# Altium schematic symbol library Diodes - TVS.SchLib: 5379 symbols (part 11 of 35) (continued)
## RCLAMP1521P.TCT (continued)
TVS DIODE 15V 30V SLP1006P2; Manufacturer: Semtech Corporation; Bidirectional Channels: 1; Capacitance @ Frequency: 0.3pF @ 1MHz; Current - Peak Pulse (10/1000µs): 4A (8/20µs); Power Line Protection: No; Power - Peak Pulse: 120W; Type: Zener; Voltage - Breakdown (Min): 16.7V; Voltage - Reverse Standoff (Typ): 15V (Max); Part Number: RCLAMP1521P.TCT; Applications: General Purpose; ComponentLink1Description: Datasheet; ComponentLink1URL: https://semtech.my.salesforce.com/sfc/p/#E0000000JelG/a/44000000MCUn/HAw56IA3vm9.Fq.kV0q5lKQUjITj9qsZJYMhG0ExhTo; ComponentLink2Description: DigiKey Link; ComponentLink2URL: http://digikey.com/product-detail/en/semtech-corporation/RCLAMP1521P.TCT/RCLAMP1521P.TCTCT-ND/5113723; Device Package: 0402 (1006 Metric); LastUpdated: 9/2/2020 1:28:48 AM; Lifecycle Status: Active; Minimum Order: 1; Mounting Type: Surface Mount; Operating Temperature: -55°C ~ 125°C (TJ); Package / Case: 0402 (1006 Metric); Packaging: TapeAndReel; PartId: 10409; Part Status: Active; Price: 0.33; Series: RailClamp®; Supplier 1: DigiKey; Supplier Part Number 1: RCLAMP1521P.TCTCT-ND; Supplier Device Package: SLP1006P2; Voltage - Clamping (Max) @ Ipp: 30V
footprint 0402
pins: 1, 2

## RCLAMP1521PQTCT
designator D?
TVS DIODE 15V 35V SLP1006P2; Manufacturer: Semtech Corporation; Bidirectional Channels: 1; Capacitance @ Frequency: 0.3pF @ 1MHz; Current - Peak Pulse (10/1000µs): 4A (8/20µs); Power Line Protection: No; Power - Peak Pulse: 120W; Type: Zener; Voltage - Breakdown (Min): 16.7V; Voltage - Reverse Standoff (Typ): 15V (Max); Part Number: RCLAMP1521PQTCT; Applications: Automotive; ComponentLink1Description: Datasheet; ComponentLink1URL: https://www.semtech.com/uploads/documents/rclamp1521pq.pdf; ComponentLink2Description: DigiKey Link; ComponentLink2URL: http://digikey.com/product-detail/en/semtech-corporation/RCLAMP1521PQTCT/RCLAMP1521PQTCTCT-ND/4626687; Device Package: 0402 (1006 Metric); LastUpdated: 9/2/2020 1:28:49 AM; Lifecycle Status: Active; Minimum Order: 1; Mounting Type: Surface Mount; Operating Temperature: -40°C ~ 125°C (TJ); Package / Case: 0402 (1006 Metric); Packaging: TapeAndReel; PartId: 10488; Part Status: Active; Price: 0.40; Series: Automotive, AEC-Q100, RailClamp®; Supplier 1: DigiKey; Supplier Part Number 1: RCLAMP1521PQTCTCT-ND; Supplier Device Package: SLP1006P2; Voltage - Clamping (Max) @ Ipp: 35V
footprint 0402
pins: 1, 2

## RCLAMP2431T.TCT
designator D?
TVS DIODE 24V 50V SLP1006P2T; Manufacturer: Semtech Corporation; Bidirectional Channels: 1; Capacitance @ Frequency: 0.35pF @ 1MHz; Current - Peak Pulse (10/1000µs): 2A (8/20µs); Power Line Protection: No; Power - Peak Pulse: 100W; Type: Zener; Voltage - Breakdown (Min): 26.7V; Voltage - Reverse Standoff (Typ): 24V (Max); Part Number: RCLAMP2431T.TCT; Applications: General Purpose; ComponentLink1Description: Datasheet; ComponentLink1URL: https://www.semtech.com/uploads/documents/rclamp2431t.pdf; ComponentLink2Description: DigiKey Link; ComponentLink2URL: http://digikey.com/product-detail/en/semtech-corporation/RCLAMP2431T.TCT/RCLAMP2431TTCTCT-ND/4626689; Device Package: 0402 (1006 Metric); LastUpdated: 9/2/2020 1:28:48 AM; Lifecycle Status: Active; Minimum Order: 1; Mounting Type: Surface Mount; Operating Temperature: -40°C ~ 85°C (TJ); Package / Case: 0402 (1006 Metric); Packaging: TapeAndReel; PartId: 10436; Part Status: Active; Price: 0.35; Series: RailClamp®; Supplier 1: DigiKey; Supplier Part Number 1: RCLAMP2431TTCTCT-ND; Supplier Device Package: SLP1006P2T; Voltage - Clamping (Max) @ Ipp: 50V
footprint 0402
pins: 1, 2

## RCLAMP2431TQTCT
designator D?
TVS DIODE 24V 50V SLP1006P2T; Manufacturer: Semtech Corporation; Bidirectional Channels: 1; Capacitance @ Frequency: 0.35pF @ 1MHz; Current - Peak Pulse (10/1000µs): 2A (8/20µs); Power Line Protection: No; Power - Peak Pulse: 100W; Type: Zener; Voltage - Breakdown (Min): 26.7V; Voltage - Reverse Standoff (Typ): 24V (Max); Part Number: RCLAMP2431TQTCT; Applications: Automotive; ComponentLink1Description: Datasheet; ComponentLink1URL: https://www.semtech.com/uploads/documents/rclamp2431tq.pdf; ComponentLink2Description: DigiKey Link; ComponentLink2URL: http://digikey.com/product-detail/en/semtech-corporation/RCLAMP2431TQTCT/RCLAMP2431TQTCTCT-ND/4626690; Device Package: 0402 (1006 Metric); LastUpdated: 9/2/2020 1:28:48 AM; Lifecycle Status: Active; Minimum Order: 1; Mounting Type: Surface Mount; Operating Temperature: -40°C ~ 125°C (TJ); Package / Case: 0402 (1006 Metric); Packaging: TapeAndReel; PartId: 10407; Part Status: Active; Price: 0.47; Series: Automotive, AEC-Q100, RailClamp®; Supplier 1: DigiKey; Supplier Part Number 1: RCLAMP2431TQTCTCT-ND; Supplier Device Package: SLP1006P2T; Voltage - Clamping (Max) @ Ipp: 50V
footprint 0402
pins: 1, 2

## RCLAMP3321P.TNT
designator D?
TVS DIODE 3.3V 13V SLP1006P2; Manufacturer: Semtech Corporation; Bidirectional Channels: 1; Capacitance @ Frequency: 0.22pF @ 1MHz; Current - Peak Pulse (10/1000µs): 4A (8/20µs); Power Line Protection: No; Power - Peak Pulse: 25W; Type: Zener; Voltage - Breakdown (Min): 5.5V; Voltage - Reverse Standoff (Typ): 3.3V (Max); Part Number: RCLAMP3321P.TNT; Applications: HDMI; ComponentLink1Description: Datasheet; ComponentLink1URL: https://www.semtech.com/uploads/documents/rclamp3321p.pdf; ComponentLink2Description: DigiKey Link; ComponentLink2URL: http://digikey.com/product-detail/en/semtech-corporation/RCLAMP3321P.TNT/RCLAMP3321P.TNTCT-ND/5067283; Device Package: 0402 (1006 Metric); LastUpdated: 9/2/2020 1:28:48 AM; Lifecycle Status: Active; Minimum Order: 1; Mounting Type: Surface Mount; Operating Temperature: -55°C ~ 125°C (TJ); Package / Case: 0402 (1006 Metric); Packaging: TapeAndReel; PartId: 10417; Part Status: Active; Price: 0.25; Series: RailClamp®; Supplier 1: DigiKey; Supplier Part Number 1: RCLAMP3321P.TNTCT-ND; Supplier Device Package: SLP1006P2; Voltage - Clamping (Max) @ Ipp: 13V
footprint 0402
pins: 1, 2

## RCLAMP3521P.TNT
designator D?
TVS DIODE 3.5V 13V SLP1006P2; Manufacturer: Semtech Corporation; Bidirectional Channels: 1; Capacitance @ Frequency: 0.33pF @ 1MHz; Current - Peak Pulse (10/1000µs): 4A (8/20µs); Power Line Protection: No; Power - Peak Pulse: 50W; Type: Zener; Voltage - Breakdown (Min): 4.5V; Voltage - Reverse Standoff (Typ): 3.5V (Max); Part Number: RCLAMP3521P.TNT; Applications: General Purpose; ComponentLink1Description: Datasheet; ComponentLink1URL: https://www.semtech.com/uploads/documents/RClamp3521P.pdf; ComponentLink2Description: DigiKey Link; ComponentLink2URL: http://digikey.com/product-detail/en/semtech-corporation/RCLAMP3521P.TNT/RCLAMP3521P.TNTCT-ND/5226788; Device Package: 0402 (1006 Metric); LastUpdated: 9/2/2020 1:28:48 AM; Lifecycle Status: Active; Minimum Order: 1; Mounting Type: Surface Mount; Operating Temperature: -40°C ~ 125°C (TJ); Package / Case: 0402 (1006 Metric); Packaging: TapeAndReel; PartId: 10419; Part Status: Active; Price: 0.25; Series: RailClamp®; Supplier 1: DigiKey; Supplier Part Number 1: RCLAMP3521P.TNTCT-ND; Supplier Device Package: SLP1006P2; Voltage - Clamping (Max) @ Ipp: 13V
footprint 0402
pins: 1, 2

## RSB5.6SMFHT2N
designator D?
BI-DIRECTIONAL ZENER DIODES (COR; Manufacturer: Rohm Semiconductor; Bidirectional Channels: 1; Capacitance @ Frequency: 50pF @ 1MHz; Power Line Protection: No; Power - Peak Pulse: 10W; Part Number: RSB5.6SMFHT2N; Applications: Automotive; ComponentLink1Description: Datasheet; ComponentLink1URL: https://www.rohm.com/datasheet/RSB5.6SMFH/rsb5.6smfh; ComponentLink2Description: DigiKey Link; ComponentLink2URL: http://digikey.com/product-detail/en/rohm-semiconductor/RSB5.6SMFHT2N/RSB5.6SMFHT2NTR-ND/9697321; LastUpdated: 9/2/2020 1:28:25 AM; Lifecycle Status: Active; Minimum Order: 0; Mounting Type: Surface Mount; Operating Temperature: 150°C (TJ); Package / Case: SC-79, SOD-523; Packaging: TapeAndReel; PartId: 9825; Part Status: Active; Price: 0.08; Series: Automotive, AEC-Q101; Supplier 1: DigiKey; Supplier Part Number 1: RSB5.6SMFHT2NTR-ND; Supplier Device Package: EMD2; Type: Zener
footprint SOD523F
pins: 1, 2

## RSB5.6SMT2N
designator D?
TVS DIODE 2.5V EMD2; Manufacturer: Rohm Semiconductor; Bidirectional Channels: 1; Power Line Protection: No; Power - Peak Pulse: 10W; Type: Zener; Voltage - Breakdown (Min): 4.76V; Part Number: RSB5.6SMT2N; Applications: General Purpose; ComponentLink1Description: Datasheet; ComponentLink1URL: http://rohmfs.rohm.com/en/products/databook/datasheet/discrete/diode/zener/rsb5.6sm.pdf; ComponentLink2Description: DigiKey Link; ComponentLink2URL: http://digikey.com/product-detail/en/rohm-semiconductor/RSB5.6SMT2N/RSB5.6SMT2NTR-ND/3443621; LastUpdated: 9/2/2020 1:28:25 AM; Lifecycle Status: Active; Minimum Order: 0; Mounting Type: Surface Mount; Operating Temperature: -55°C ~ 150°C (TJ); Package / Case: SC-79, SOD-523; Packaging: TapeAndReel; PartId: 9813; Part Status: Active; Price: 0.05; Series: -; Supplier 1: DigiKey; Supplier Part Number 1: RSB5.6SMT2NTR-ND; Supplier Device Package: EMD2; Voltage - Reverse Standoff (Typ): 2.5V
footprint SOD523F
pins: 1, 2

## RSB6.8SMFHT2N
designator D?
BI-DIRECTIONAL ZENER DIODES (COR; Manufacturer: Rohm Semiconductor; Bidirectional Channels: 1; Capacitance @ Frequency: 30pF @ 1MHz; Power Line Protection: No; Power - Peak Pulse: 10W; Part Number: RSB6.8SMFHT2N; Applications: Automotive; ComponentLink1Description: Datasheet; ComponentLink1URL: https://www.rohm.com/datasheet/RSB6.8SMFH/rsb6.8smfh; ComponentLink2Description: DigiKey Link; ComponentLink2URL: http://digikey.com/product-detail/en/rohm-semiconductor/RSB6.8SMFHT2N/RSB6.8SMFHT2NTR-ND/9697322; LastUpdated: 9/2/2020 1:28:25 AM; Lifecycle Status: Active; Minimum Order: 0; Mounting Type: Surface Mount; Operating Temperature: 150°C (TJ); Package / Case: SC-79, SOD-523; Packaging: TapeAndReel; PartId: 9826; Part Status: Active; Price: 0.08; Series: Automotive, AEC-Q101; Supplier 1: DigiKey; Supplier Part Number 1: RSB6.8SMFHT2NTR-ND; Supplier Device Package: EMD2; Type: Zener
footprint SOD523F
pins: 1, 2

## RSB6.8SMT2N
designator D?
TVS DIODE 3.5V EMD2; Manufacturer: Rohm Semiconductor; Bidirectional Channels: 1; Capacitance @ Frequency: 30pF @ 1MHz; Power Line Protection: No; Power - Peak Pulse: 10W; Type: Zener; Voltage - Breakdown (Min): 5.78V; Part Number: RSB6.8SMT2N; Applications: General Purpose; ComponentLink1Description: Datasheet; ComponentLink1URL: http://rohmfs.rohm.com/en/products/databook/datasheet/discrete/diode/zener/rsb6.8sm.pdf; ComponentLink2Description: DigiKey Link; ComponentLink2URL: http://digikey.com/product-detail/en/rohm-semiconductor/RSB6.8SMT2N/RSB6.8SMT2NTR-ND/5721280; LastUpdated: 9/2/2020 1:28:25 AM; Lifecycle Status: Active; Minimum Order: 0; Mounting Type: Surface Mount; Operating Temperature: -55°C ~ 150°C (TJ); Package / Case: SC-79, SOD-523; Packaging: TapeAndReel; PartId: 9814; Part Status: Active; Price: 0.05; Series: -; Supplier 1: DigiKey; Supplier Part Number 1: RSB6.8SMT2NTR-ND; Supplier Device Package: EMD2; Voltage - Reverse Standoff (Typ): 3.5V
footprint SOD523F
pins: 1, 2

## RSB16VTE-17
designator D?
TVS DIODE 12V UMD2; Manufacturer: Rohm Semiconductor; Bidirectional Channels: 1; Power Line Protection: No; Type: Zener; Voltage - Breakdown (Min): 14.4V; Part Number: RSB16VTE-17; Applications: General Purpose; ComponentLink1Description: Datasheet; ComponentLink1URL: http://rohmfs.rohm.com/en/products/databook/datasheet/discrete/diode/zener/rsb16v.pdf; ComponentLink2Description: DigiKey Link; ComponentLink2URL: http://digikey.com/product-detail/en/rohm-semiconductor/RSB16VTE-17/RSB16VTE-17TR-ND/2095518; LastUpdated: 9/2/2020 1:28:42 AM; Lifecycle Status: Active; Minimum Order: 0; Mounting Type: Surface Mount; Package / Case: SC-90, SOD-323F; Packaging: TapeAndReel; PartId: 10362; Part Status: Active; Price: 0.11; Series: -; Supplier 1: DigiKey; Supplier Part Number 1: RSB16VTE-17TR-ND; Supplier Device Package: UMD2; Voltage - Reverse Standoff (Typ): 12V
footprint SOD323F
pins: 1, 2

## RSB18VTE-17
designator D?
TVS DIODE 13V UMD2; Manufacturer: Rohm Semiconductor; Bidirectional Channels: 1; Power Line Protection: No; Type: Zener; Voltage - Breakdown (Min): 16.2V; Part Number: RSB18VTE-17; Applications: General Purpose; ComponentLink1Description: Datasheet; ComponentLink1URL: http://rohmfs.rohm.com/en/products/databook/datasheet/discrete/diode/zener/rsb18v.pdf; ComponentLink2Description: DigiKey Link; ComponentLink2URL: http://digikey.com/product-detail/en/rohm-semiconductor/RSB18VTE-17/RSB18VTE-17TR-ND/2095520; LastUpdated: 9/2/2020 1:28:42 AM; Lifecycle Status: Active; Minimum Order: 0; Mounting Type: Surface Mount; Package / Case: SC-90, SOD-323F; Packaging: TapeAndReel; PartId: 10361; Part Status: Active; Price: 0.11; Series: -; Supplier 1: DigiKey; Supplier Part Number 1: RSB18VTE-17TR-ND; Supplier Device Package: UMD2; Voltage - Reverse Standoff (Typ): 13V
footprint SOD323F
pins: 1, 2

## RSB27VTE-17
designator D?
TVS DIODE 24V UMD2; Manufacturer: Rohm Semiconductor; Bidirectional Channels: 1; Power Line Protection: No; Type: Zener; Voltage - Breakdown (Min): 26.2V; Part Number: RSB27VTE-17; Applications: General Purpose; ComponentLink1Description: Datasheet; ComponentLink1URL: http://rohmfs.rohm.com/en/products/databook/datasheet/discrete/diode/zener/rsb27v.pdf; ComponentLink2Description: DigiKey Link; ComponentLink2URL: http://digikey.com/product-detail/en/rohm-semiconductor/RSB27VTE-17/RSB27VTE-17TR-ND/2095522; LastUpdated: 9/2/2020 1:28:42 AM; Lifecycle Status: Active; Minimum Order: 0; Mounting Type: Surface Mount; Package / Case: SC-90, SOD-323F; Packaging: TapeAndReel; PartId: 10358; Part Status: Active; Price: 0.11; Series: -; Supplier 1: DigiKey; Supplier Part Number 1: RSB27VTE-17TR-ND; Supplier Device Package: UMD2; Voltage - Reverse Standoff (Typ): 24V
footprint SOD323F
pins: 1, 2

## RSB33VTE-17
designator D?
TVS DIODE 25V UMD2; Manufacturer: Rohm Semiconductor; Bidirectional Channels: 1; Capacitance @ Frequency: 30pF @ 1MHz; Power Line Protection: No; Type: Zener; Voltage - Breakdown (Min): 29.7V; Part Number: RSB33VTE-17; Applications: General Purpose; ComponentLink1Description: Datasheet; ComponentLink1URL: http://rohmfs.rohm.com/en/products/databook/datasheet/discrete/diode/zener/rsb33v.pdf; ComponentLink2Description: DigiKey Link; ComponentLink2URL: http://digikey.com/product-detail/en/rohm-semiconductor/RSB33VTE-17/RSB33VTE-17TR-ND/3443618; LastUpdated: 9/2/2020 1:28:42 AM; Lifecycle Status: Active; Minimum Order: 0; Mounting Type: Surface Mount; Package / Case: SC-90, SOD-323F; Packaging: TapeAndReel; PartId: 10360; Part Status: Active; Price: 0.10; Series: -; Supplier 1: DigiKey; Supplier Part Number 1: RSB33VTE-17TR-ND; Supplier Device Package: UMD2; Voltage - Reverse Standoff (Typ): 25V
footprint SOD323F
pins: 1, 2

## RSB36VTE-17
designator D?
TVS DIODE 27V UMD2; Manufacturer: Rohm Semiconductor; Bidirectional Channels: 1; Capacitance @ Frequency: 30pF @ 1MHz; Power Line Protection: No; Type: Zener; Voltage - Breakdown (Min): 32.4V; Part Number: RSB36VTE-17; Applications: General Purpose; ComponentLink1Description: Datasheet; ComponentLink1URL: http://rohmfs.rohm.com/en/products/databook/datasheet/discrete/diode/zener/rsb36v.pdf; ComponentLink2Description: DigiKey Link; ComponentLink2URL: http://digikey.com/product-detail/en/rohm-semiconductor/RSB36VTE-17/RSB36VTE-17TR-ND/3443619; LastUpdated: 9/2/2020 1:28:42 AM; Lifecycle Status: Active; Minimum Order: 0; Mounting Type: Surface Mount; Package / Case: SC-90, SOD-323F; Packaging: TapeAndReel; PartId: 10363; Part Status: Active; Price: 0.10; Series: -; Supplier 1: DigiKey; Supplier Part Number 1: RSB36VTE-17TR-ND; Supplier Device Package: UMD2; Voltage - Reverse Standoff (Typ): 27V
footprint SOD323F
pins: 1, 2

## RSB39VTE-17
designator D?
TVS DIODE 30V UMD2; Manufacturer: Rohm Semiconductor; Bidirectional Channels: 1; Capacitance @ Frequency: 30pF @ 1MHz; Power Line Protection: No; Type: Zener; Voltage - Breakdown (Min): 35.1V; Part Number: RSB39VTE-17; Applications: General Purpose; ComponentLink1Description: Datasheet; ComponentLink1URL: http://rohmfs.rohm.com/en/products/databook/datasheet/discrete/diode/zener/rsb39v.pdf; ComponentLink2Description: DigiKey Link; ComponentLink2URL: http://digikey.com/product-detail/en/rohm-semiconductor/RSB39VTE-17/RSB39VTE-17TR-ND/3443620; LastUpdated: 9/2/2020 1:28:42 AM; Lifecycle Status: Active; Minimum Order: 0; Mounting Type: Surface Mount; Package / Case: SC-90, SOD-323F; Packaging: TapeAndReel; PartId: 10359; Part Status: Active; Price: 0.08; Series: -; Supplier 1: DigiKey; Supplier Part Number 1: RSB39VTE-17TR-ND; Supplier Device Package: UMD2; Voltage - Reverse Standoff (Typ): 30V
footprint SOD323F
pins: 1, 2

## SACB5.0
designator D?
TVS DIODE 5V 10V SMB; Manufacturer: Littelfuse Inc.; Current - Peak Pulse (10/1000µs): 44A; Power Line Protection: No; Power - Peak Pulse: 500W; Type: Zener; Unidirectional Channels: 1; Voltage - Breakdown (Min): 7.6V; Part Number: SACB5.0; Applications: General Purpose; ComponentLink1Description: Datasheet; ComponentLink1URL: https://www.littelfuse.com/~/media/electronics/datasheets/tvs_diodes/littelfuse_tvs_diode_sacb_datasheet.pdf.pdf; ComponentLink2Description: DigiKey Link; ComponentLink2URL: http://digikey.com/product-detail/en/littelfuse-inc/SACB5.0/SACB5.0CT-ND/1835351; LastUpdated: 9/2/2020 1:19:43 AM; Lifecycle Status: Active; Minimum Order: 1; Mounting Type: Surface Mount; Operating Temperature: -55°C ~ 150°C (TJ); Package / Case: DO-214AA, SMB; Packaging: TapeAndReel; PartId: 10519; Part Status: Active; Price: 0.24; Series: SACB; Supplier 1: DigiKey; Supplier Part Number 1: SACB5.0CT-ND; Supplier Device Package: SMB; Voltage - Clamping (Max) @ Ipp: 10V; Voltage - Reverse Standoff (Typ): 5V
footprint DO214AA SMB
pins: 1, 2

## SACB6.0
designator D?
TVS DIODE 6V 11.2V SMB; Manufacturer: Littelfuse Inc.; Current - Peak Pulse (10/1000µs): 41A; Power Line Protection: No; Power - Peak Pulse: 500W; Type: Zener; Unidirectional Channels: 1; Voltage - Breakdown (Min): 7.9V; Part Number: SACB6.0; Applications: General Purpose; ComponentLink1Description: Datasheet; ComponentLink1URL: https://www.littelfuse.com/~/media/electronics/datasheets/tvs_diodes/littelfuse_tvs_diode_sacb_datasheet.pdf.pdf; ComponentLink2Description: DigiKey Link; ComponentLink2URL: http://digikey.com/product-detail/en/littelfuse-inc/SACB6.0/SACB6.0CT-ND/2699865; LastUpdated: 9/2/2020 1:19:43 AM; Lifecycle Status: Active; Minimum Order: 1; Mounting Type: Surface Mount; Operating Temperature: -55°C ~ 150°C (TJ); Package / Case: DO-214AA, SMB; Packaging: TapeAndReel; PartId: 10521; Part Status: Active; Price: 0.24; Series: SACB; Supplier 1: DigiKey; Supplier Part Number 1: SACB6.0CT-ND; Supplier Device Package: SMB; Voltage - Clamping (Max) @ Ipp: 11.2V; Voltage - Reverse Standoff (Typ): 6V
footprint DO214AA SMB
pins: 1, 2

## SACB7.0
designator D?
TVS DIODE 7V 12.6V SMB; Manufacturer: Littelfuse Inc.; Current - Peak Pulse (10/1000µs): 38A; Power Line Protection: No; Power - Peak Pulse: 500W; Type: Zener; Unidirectional Channels: 1; Voltage - Breakdown (Min): 8.33V; Part Number: SACB7.0; Applications: General Purpose; ComponentLink1Description: Datasheet; ComponentLink1URL: https://www.littelfuse.com/~/media/electronics/datasheets/tvs_diodes/littelfuse_tvs_diode_sacb_datasheet.pdf.pdf; ComponentLink2Description: DigiKey Link; ComponentLink2URL: http://digikey.com/product-detail/en/littelfuse-inc/SACB7.0/SACB7.0CT-ND/2699866; LastUpdated: 9/2/2020 1:19:46 AM; Lifecycle Status: Active; Minimum Order: 1; Mounting Type: Surface Mount; Operating Temperature: -55°C ~ 150°C (TJ); Package / Case: DO-214AA, SMB; Packaging: TapeAndReel; PartId: 10823; Part Status: Active; Price: 0.24; Series: SACB; Supplier 1: DigiKey; Supplier Part Number 1: SACB7.0CT-ND; Supplier Device Package: SMB; Voltage - Clamping (Max) @ Ipp: 12.6V; Voltage - Reverse Standoff (Typ): 7V
footprint DO214AA SMB
pins: 1, 2

## SACB8.0
designator D?
TVS DIODE 8V 13.4V DO214AA; Manufacturer: Littelfuse Inc.; Current - Peak Pulse (10/1000µs): 36A; Power Line Protection: No; Power - Peak Pulse: 500W; Type: Zener; Unidirectional Channels: 1; Voltage - Breakdown (Min): 8.89V; Part Number: SACB8.0; Applications: General Purpose; ComponentLink1Description: Datasheet; ComponentLink1URL: https://www.littelfuse.com/~/media/electronics/datasheets/tvs_diodes/littelfuse_tvs_diode_sacb_datasheet.pdf.pdf; ComponentLink2Description: DigiKey Link; ComponentLink2URL: http://digikey.com/product-detail/en/littelfuse-inc/SACB8.0/1294-SACB8.0-CHP/5731810; LastUpdated: 9/2/2020 1:19:49 AM; Lifecycle Status: Active; Minimum Order: 3000; Mounting Type: Surface Mount; Operating Temperature: -55°C ~ 150°C (TJ); Package / Case: DO-214AA, SMB; Packaging: TapeAndReel; PartId: 11154; Part Status: Active; Price: 0.18; Series: SACB; Supplier 1: DigiKey; Supplier Part Number 1: 1294-SACB8.0-CHP; Supplier Device Package: DO-214AA (SMBJ); Voltage - Clamping (Max) @ Ipp: 13.4V; Voltage - Reverse Standoff (Typ): 8V
footprint DO214AA SMB
pins: 1, 2

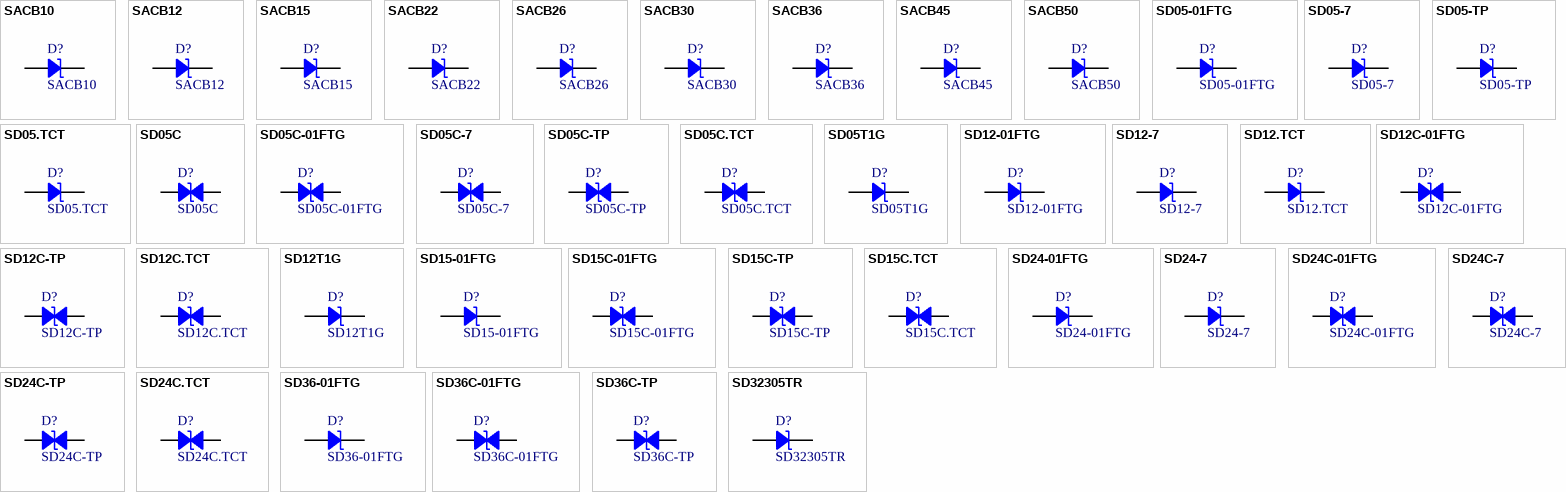
[diagram p39: symbols SACB10 to SD32305TR]

## SACB10
designator D?
TVS DIODE 10V 16.3V SMB; Manufacturer: Littelfuse Inc.; Current - Peak Pulse (10/1000µs): 29A; Power Line Protection: No; Power - Peak Pulse: 500W; Type: Zener; Unidirectional Channels: 1; Voltage - Breakdown (Min): 11.1V; Part Number: SACB10; Applications: General Purpose; ComponentLink1Description: Datasheet; ComponentLink1URL: https://www.littelfuse.com/~/media/electronics/datasheets/tvs_diodes/littelfuse_tvs_diode_sacb_datasheet.pdf.pdf; ComponentLink2Description: DigiKey Link; ComponentLink2URL: http://digikey.com/product-detail/en/littelfuse-inc/SACB10/SACB10CT-ND/2699857; LastUpdated: 9/2/2020 1:19:45 AM; Lifecycle Status: Active; Minimum Order: 1; Mounting Type: Surface Mount; Operating Temperature: -55°C ~ 150°C (TJ); Package / Case: DO-214AA, SMB; Packaging: TapeAndReel; PartId: 10730; Part Status: Active; Price: 0.18; Series: SACB; Supplier 1: DigiKey; Supplier Part Number 1: SACB10CT-ND; Supplier Device Package: SMB; Voltage - Clamping (Max) @ Ipp: 16.3V; Voltage - Reverse Standoff (Typ): 10V
footprint DO214AA SMB
pins: 1, 2

## SACB12
designator D?
TVS DIODE 12V 19V SMB; Manufacturer: Littelfuse Inc.; Current - Peak Pulse (10/1000µs): 25A; Power Line Protection: No; Power - Peak Pulse: 500W; Type: Zener; Unidirectional Channels: 1; Voltage - Breakdown (Min): 13.3V; Part Number: SACB12; Applications: General Purpose; ComponentLink1Description: Datasheet; ComponentLink1URL: https://www.littelfuse.com/~/media/electronics/datasheets/tvs_diodes/littelfuse_tvs_diode_sacb_datasheet.pdf.pdf; ComponentLink2Description: DigiKey Link; ComponentLink2URL: http://digikey.com/product-detail/en/littelfuse-inc/SACB12/SACB12CT-ND/1835352; LastUpdated: 9/2/2020 1:19:47 AM; Lifecycle Status: Active; Minimum Order: 1; Mounting Type: Surface Mount; Operating Temperature: -55°C ~ 150°C (TJ); Package / Case: DO-214AA, SMB; Packaging: TapeAndReel; PartId: 10900; Part Status: Active; Price: 0.24; Series: SACB; Supplier 1: DigiKey; Supplier Part Number 1: SACB12CT-ND; Supplier Device Package: SMB; Voltage - Clamping (Max) @ Ipp: 19V; Voltage - Reverse Standoff (Typ): 12V
footprint DO214AA SMB
pins: 1, 2

## SACB15
designator D?
TVS DIODE 15V 23.6V SMB; Manufacturer: Littelfuse Inc.; Current - Peak Pulse (10/1000µs): 20A; Power Line Protection: No; Power - Peak Pulse: 500W; Type: Zener; Unidirectional Channels: 1; Voltage - Breakdown (Min): 16.7V; Part Number: SACB15; Applications: General Purpose; ComponentLink1Description: Datasheet; ComponentLink1URL: https://www.littelfuse.com/~/media/electronics/datasheets/tvs_diodes/littelfuse_tvs_diode_sacb_datasheet.pdf.pdf; ComponentLink2Description: DigiKey Link; ComponentLink2URL: http://digikey.com/product-detail/en/littelfuse-inc/SACB15/SACB15CT-ND/2699858; LastUpdated: 9/2/2020 1:19:51 AM; Lifecycle Status: Active; Minimum Order: 1; Mounting Type: Surface Mount; Operating Temperature: -55°C ~ 150°C (TJ); Package / Case: DO-214AA, SMB; Packaging: TapeAndReel; PartId: 11310; Part Status: Active; Price: 0.24; Series: SACB; Supplier 1: DigiKey; Supplier Part Number 1: SACB15CT-ND; Supplier Device Package: SMB; Voltage - Clamping (Max) @ Ipp: 23.6V; Voltage - Reverse Standoff (Typ): 15V
footprint DO214AA SMB
pins: 1, 2

## SACB22
designator D?
TVS DIODE 22V 35.4V SMB; Manufacturer: Littelfuse Inc.; Current - Peak Pulse (10/1000µs): 14A; Power Line Protection: No; Power - Peak Pulse: 500W; Type: Zener; Unidirectional Channels: 1; Voltage - Breakdown (Min): 24.4V; Part Number: SACB22; Applications: General Purpose; ComponentLink1Description: Datasheet; ComponentLink1URL: https://www.littelfuse.com/~/media/electronics/datasheets/tvs_diodes/littelfuse_tvs_diode_sacb_datasheet.pdf.pdf; ComponentLink2Description: DigiKey Link; ComponentLink2URL: http://digikey.com/product-detail/en/littelfuse-inc/SACB22/SACB22CT-ND/2699859; LastUpdated: 9/2/2020 1:19:43 AM; Lifecycle Status: Active; Minimum Order: 1; Mounting Type: Surface Mount; Operating Temperature: -55°C ~ 150°C (TJ); Package / Case: DO-214AA, SMB; Packaging: TapeAndReel; PartId: 10518; Part Status: Active; Price: 0.24; Series: SACB; Supplier 1: DigiKey; Supplier Part Number 1: SACB22CT-ND; Supplier Device Package: SMB; Voltage - Clamping (Max) @ Ipp: 35.4V; Voltage - Reverse Standoff (Typ): 22V
footprint DO214AA SMB
pins: 1, 2

## SACB26
designator D?
TVS DIODE 26V 42.3V SMB; Manufacturer: Littelfuse Inc.; Current - Peak Pulse (10/1000µs): 11.1A; Power Line Protection: No; Power - Peak Pulse: 500W; Type: Zener; Unidirectional Channels: 1; Voltage - Breakdown (Min): 28.9V; Part Number: SACB26; Applications: General Purpose; ComponentLink1Description: Datasheet; ComponentLink1URL: https://www.littelfuse.com/~/media/electronics/datasheets/tvs_diodes/littelfuse_tvs_diode_sacb_datasheet.pdf.pdf; ComponentLink2Description: DigiKey Link; ComponentLink2URL: http://digikey.com/product-detail/en/littelfuse-inc/SACB26/SACB26CT-ND/2699860; LastUpdated: 9/2/2020 1:19:45 AM; Lifecycle Status: Active; Minimum Order: 1; Mounting Type: Surface Mount; Operating Temperature: -55°C ~ 150°C (TJ); Package / Case: DO-214AA, SMB; Packaging: TapeAndReel; PartId: 10729; Part Status: Active; Price: 0.24; Series: SACB; Supplier 1: DigiKey; Supplier Part Number 1: SACB26CT-ND; Supplier Device Package: SMB; Voltage - Clamping (Max) @ Ipp: 42.3V; Voltage - Reverse Standoff (Typ): 26V
footprint DO214AA SMB
pins: 1, 2

## SACB30
designator D?
TVS DIODE 30V 48.6V SMB; Manufacturer: Littelfuse Inc.; Current - Peak Pulse (10/1000µs): 10A; Power Line Protection: No; Power - Peak Pulse: 500W; Type: Zener; Unidirectional Channels: 1; Voltage - Breakdown (Min): 33.3V; Part Number: SACB30; Applications: General Purpose; ComponentLink1Description: Datasheet; ComponentLink1URL: https://www.littelfuse.com/~/media/electronics/datasheets/tvs_diodes/littelfuse_tvs_diode_sacb_datasheet.pdf.pdf; ComponentLink2Description: DigiKey Link; ComponentLink2URL: http://digikey.com/product-detail/en/littelfuse-inc/SACB30/SACB30CT-ND/2699861; LastUpdated: 9/2/2020 1:19:45 AM; Lifecycle Status: Active; Minimum Order: 1; Mounting Type: Surface Mount; Operating Temperature: -55°C ~ 150°C (TJ); Package / Case: DO-214AA, SMB; Packaging: TapeAndReel; PartId: 10731; Part Status: Active; Price: 0.24; Series: SACB; Supplier 1: DigiKey; Supplier Part Number 1: SACB30CT-ND; Supplier Device Package: SMB; Voltage - Clamping (Max) @ Ipp: 48.6V; Voltage - Reverse Standoff (Typ): 30V
footprint DO214AA SMB
pins: 1, 2

## SACB36
designator D?
TVS DIODE 36V 60V SMB; Manufacturer: Littelfuse Inc.; Current - Peak Pulse (10/1000µs): 8.6A; Power Line Protection: No; Power - Peak Pulse: 500W; Type: Zener; Unidirectional Channels: 1; Voltage - Breakdown (Min): 40V; Part Number: SACB36; Applications: General Purpose; ComponentLink1Description: Datasheet; ComponentLink1URL: https://www.littelfuse.com/~/media/electronics/datasheets/tvs_diodes/littelfuse_tvs_diode_sacb_datasheet.pdf.pdf; ComponentLink2Description: DigiKey Link; ComponentLink2URL: http://digikey.com/product-detail/en/littelfuse-inc/SACB36/SACB36CT-ND/2699862; LastUpdated: 9/2/2020 1:19:43 AM; Lifecycle Status: Active; Minimum Order: 1; Mounting Type: Surface Mount; Operating Temperature: -55°C ~ 150°C (TJ); Package / Case: DO-214AA, SMB; Packaging: TapeAndReel; PartId: 10522; Part Status: Active; Price: 0.24; Series: SACB; Supplier 1: DigiKey; Supplier Part Number 1: SACB36CT-ND; Supplier Device Package: SMB; Voltage - Clamping (Max) @ Ipp: 60V; Voltage - Reverse Standoff (Typ): 36V
footprint DO214AA SMB
pins: 1, 2

## SACB45
designator D?
TVS DIODE 45V 77V SMB; Manufacturer: Littelfuse Inc.; Current - Peak Pulse (10/1000µs): 6.8A; Power Line Protection: No; Power - Peak Pulse: 500W; Type: Zener; Unidirectional Channels: 1; Voltage - Breakdown (Min): 50V; Part Number: SACB45; Applications: General Purpose; ComponentLink1Description: Datasheet; ComponentLink1URL: https://www.littelfuse.com/~/media/electronics/datasheets/tvs_diodes/littelfuse_tvs_diode_sacb_datasheet.pdf.pdf; ComponentLink2Description: DigiKey Link; ComponentLink2URL: http://digikey.com/product-detail/en/littelfuse-inc/SACB45/SACB45CT-ND/2699863; LastUpdated: 9/2/2020 1:19:43 AM; Lifecycle Status: Active; Minimum Order: 1; Mounting Type: Surface Mount; Operating Temperature: -55°C ~ 150°C (TJ); Package / Case: DO-214AA, SMB; Packaging: TapeAndReel; PartId: 10523; Part Status: Active; Price: 0.24; Series: SACB; Supplier 1: DigiKey; Supplier Part Number 1: SACB45CT-ND; Supplier Device Package: SMB; Voltage - Clamping (Max) @ Ipp: 77V; Voltage - Reverse Standoff (Typ): 45V
footprint DO214AA SMB
pins: 1, 2

## SACB50
designator D?
TVS DIODE 50V 88V SMB; Manufacturer: Littelfuse Inc.; Current - Peak Pulse (10/1000µs): 5.8A; Power Line Protection: No; Power - Peak Pulse: 500W; Type: Zener; Unidirectional Channels: 1; Voltage - Breakdown (Min): 55.5V; Part Number: SACB50; Applications: General Purpose; ComponentLink1Description: Datasheet; ComponentLink1URL: https://www.littelfuse.com/~/media/electronics/datasheets/tvs_diodes/littelfuse_tvs_diode_sacb_datasheet.pdf.pdf; ComponentLink2Description: DigiKey Link; ComponentLink2URL: http://digikey.com/product-detail/en/littelfuse-inc/SACB50/SACB50CT-ND/2699864; LastUpdated: 9/2/2020 1:19:43 AM; Lifecycle Status: Active; Minimum Order: 1; Mounting Type: Surface Mount; Operating Temperature: -55°C ~ 150°C (TJ); Package / Case: DO-214AA, SMB; Packaging: TapeAndReel; PartId: 10520; Part Status: Active; Price: 0.24; Series: SACB; Supplier 1: DigiKey; Supplier Part Number 1: SACB50CT-ND; Supplier Device Package: SMB; Voltage - Clamping (Max) @ Ipp: 88V; Voltage - Reverse Standoff (Typ): 50V
footprint DO214AA SMB
pins: 1, 2

## SD05-01FTG
designator D?
TVS DIODE 5V 16.8V SOD323; Manufacturer: Littelfuse Inc.; Capacitance @ Frequency: 350pF @ 1MHz; Current - Peak Pulse (10/1000µs): 30A (8/20µs); Power Line Protection: No; Power - Peak Pulse: 450W; Type: Zener; Unidirectional Channels: 1; Voltage - Reverse Standoff (Typ): 5V (Max); Part Number: SD05-01FTG; Applications: General Purpose; ComponentLink1Description: Datasheet; ComponentLink1URL: https://www.littelfuse.com/~/media/electronics/datasheets/tvs_diode_arrays/littelfuse_tvs_diode_array_sd_datasheet.pdf.pdf; ComponentLink2Description: DigiKey Link; ComponentLink2URL: http://digikey.com/product-detail/en/littelfuse-inc/SD05-01FTG/F6190CT-ND/4251859; LastUpdated: 9/2/2020 1:28:27 AM; Lifecycle Status: Active; Minimum Order: 1; Mounting Type: Surface Mount; Operating Temperature: -40°C ~ 125°C (TJ); Package / Case: SC-76, SOD-323; Packaging: TapeAndReel; PartId: 9911; Part Status: Active; Price: 0.11; Series: SD, SPA®; Supplier 1: DigiKey; Supplier Part Number 1: F6190CT-ND; Supplier Device Package: SOD-323; Voltage - Clamping (Max) @ Ipp: 16.8V
footprint SOD323
pins: 1, 2

## SD05-7
designator D?
TVS DIODE 5V 14.5V SOD323; Manufacturer: Diodes Incorporated; Capacitance @ Frequency: 350pF @ 1MHz; Current - Peak Pulse (10/1000µs): 24A (8/20µs); Power Line Protection: No; Power - Peak Pulse: 350W; Type: Zener; Unidirectional Channels: 1; Voltage - Breakdown (Min): 6.2V; Part Number: SD05-7; Applications: Automotive; ComponentLink1Description: Datasheet; ComponentLink1URL: https://www.diodes.com/assets/Datasheets/ds31594.pdf; ComponentLink2Description: DigiKey Link; ComponentLink2URL: http://digikey.com/product-detail/en/diodes-incorporated/SD05-7/SD05DICT-ND/2052820; LastUpdated: 9/2/2020 1:28:27 AM; Lifecycle Status: Active; Minimum Order: 1; Mounting Type: Surface Mount; Operating Temperature: -55°C ~ 150°C (TJ); Package / Case: SC-76, SOD-323; Packaging: TapeAndReel; PartId: 9859; Part Status: Active; Price: 0.07; Series: Automotive, AEC-Q101; Supplier 1: DigiKey; Supplier Part Number 1: SD05DICT-ND; Supplier Device Package: SOD-323; Voltage - Clamping (Max) @ Ipp: 14.5V; Voltage - Reverse Standoff (Typ): 5V
footprint SOD323
pins: 1, 2

## SD05-TP
designator D?
5V,ESD PROTECTION DEVICES,SOD-32; Manufacturer: Micro Commercial Co; Capacitance @ Frequency: 350pF @ 1MHz; Current - Peak Pulse (10/1000µs): 40A (8/20µs); Power Line Protection: No; Power - Peak Pulse: 500W; Type: Zener; Unidirectional Channels: 1; Voltage - Breakdown (Min): 6V; Voltage - Clamping (Max) @ Ipp: 12.5V; Voltage - Reverse Standoff (Typ): 5V (Max); Part Number: SD05-TP; Applications: General Purpose; ComponentLink1Description: Datasheet; ComponentLink1URL: https://www.mccsemi.com/pdf/Products/SD05(SOD-323)-B.pdf; ComponentLink2Description: DigiKey Link; ComponentLink2URL: http://digikey.com/product-detail/en/micro-commercial-co/SD05-TP/SD05-TPMSCT-ND/8554545; LastUpdated: 9/2/2020 1:28:27 AM; Lifecycle Status: Active; Minimum Order: 1; Mounting Type: Surface Mount; Operating Temperature: -55°C ~ 150°C (TJ); Package / Case: SC-76, SOD-323; Packaging: TapeAndReel; PartId: 9899; Part Status: Active; Price: 0.08; Series: -; Supplier 1: DigiKey; Supplier Part Number 1: SD05-TPMSCT-ND; Supplier Device Package: SOD-323
footprint SOD323
pins: 1, 2

## SD05.TCT
designator D?
TVS DIODE 5V 14.5V SOD323; Manufacturer: Semtech Corporation; Capacitance @ Frequency: 350pF @ 1MHz; Current - Peak Pulse (10/1000µs): 24A (8/20µs); Power Line Protection: No; Power - Peak Pulse: 350W; Type: Zener; Unidirectional Channels: 1; Voltage - Breakdown (Min): 6V; Voltage - Reverse Standoff (Typ): 5V (Max); Part Number: SD05.TCT; Applications: General Purpose; ComponentLink1Description: Datasheet; ComponentLink1URL: https://www.semtech.com/uploads/documents/sdxx.pdf; ComponentLink2Description: DigiKey Link; ComponentLink2URL: http://digikey.com/product-detail/en/semtech-corporation/SD05.TCT/SD05CT-ND/1000965; LastUpdated: 9/2/2020 1:28:26 AM; Lifecycle Status: Active; Minimum Order: 1; Mounting Type: Surface Mount; Operating Temperature: -55°C ~ 125°C (TJ); Package / Case: SC-76, SOD-323; Packaging: TapeAndReel; PartId: 9839; Part Status: Active; Price: 0.27; Series: -; Supplier 1: DigiKey; Supplier Part Number 1: SD05CT-ND; Supplier Device Package: SOD-323; Voltage - Clamping (Max) @ Ipp: 14.5V
footprint SOD323
pins: 1, 2

## SD05C
designator D?
ESD PROTECTION DIODE SOD-323; Manufacturer: Rectron USA; Bidirectional Channels: 1; Capacitance @ Frequency: 200pF @ 1MHz (Max); Current - Peak Pulse (10/1000µs): 24A (8/20µs); Power Line Protection: No; Power - Peak Pulse: 350W; Type: Zener; Voltage - Breakdown (Min): 6V; Voltage - Clamping (Max) @ Ipp: 14.5V; Voltage - Reverse Standoff (Typ): 5V (Max); Part Number: SD05C; Applications: General Purpose; ComponentLink1Description: Datasheet; ComponentLink1URL: https://www.rectron.com/public/product_datasheets/sd05c-sd24c.pdf; ComponentLink2Description: DigiKey Link; ComponentLink2URL: http://digikey.com/product-detail/en/rectron-usa/SD05C/2516-SD05CTR-ND/12088393; LastUpdated: 8/30/2020 9:07:52 PM; Lifecycle Status: Active; Minimum Order: 3000; Mounting Type: Surface Mount; Package / Case: SC-76, SOD-323; Packaging: TapeAndReel; PartId: 11460; Price: 0.04; Supplier 1: DigiKey; Supplier Part Number 1: 2516-SD05CTR-ND; Supplier Device Package: SOD-323
footprint SOD323
pins: 1, 2

## SD05C-01FTG
designator D?
TVS DIODE 5V 18V SOD323; Manufacturer: Littelfuse Inc.; Bidirectional Channels: 1; Capacitance @ Frequency: 200pF @ 1MHz; Current - Peak Pulse (10/1000µs): 30A (8/20µs); Power Line Protection: No; Power - Peak Pulse: 450W; Type: Zener; Voltage - Reverse Standoff (Typ): 5V (Max); Part Number: SD05C-01FTG; Applications: General Purpose; ComponentLink1Description: Datasheet; ComponentLink1URL: https://www.littelfuse.com/~/media/electronics/datasheets/tvs_diode_arrays/littelfuse_tvs_diode_array_sd_c_datasheet.pdf.pdf; ComponentLink2Description: DigiKey Link; ComponentLink2URL: http://digikey.com/product-detail/en/littelfuse-inc/SD05C-01FTG/F6191CT-ND/4251860; LastUpdated: 9/2/2020 1:28:29 AM; Lifecycle Status: Active; Minimum Order: 1; Mounting Type: Surface Mount; Operating Temperature: -40°C ~ 125°C (TJ); Package / Case: SC-76, SOD-323; Packaging: TapeAndReel; PartId: 9966; Part Status: Active; Price: 0.12; Series: SD-C, SPA®; Supplier 1: DigiKey; Supplier Part Number 1: F6191CT-ND; Supplier Device Package: SOD-323; Voltage - Clamping (Max) @ Ipp: 18V
footprint SOD323
pins: 1, 2

## SD05C-7
designator D?
TVS DIODE 5.5V 16V SOD323; Manufacturer: Diodes Incorporated; Bidirectional Channels: 1; Capacitance @ Frequency: 200pF @ 1MHz; Current - Peak Pulse (10/1000µs): 40A (8/20µs); Power Line Protection: No; Power - Peak Pulse: 640W; Type: Zener; Voltage - Breakdown (Min): 6V; Voltage - Reverse Standoff (Typ): 5.5V (Max); Part Number: SD05C-7; ComponentLink1Description: Datasheet; ComponentLink1URL: https://www.diodes.com/assets/Datasheets/SD05C.pdf; ComponentLink2Description: DigiKey Link; ComponentLink2URL: http://digikey.com/product-detail/en/diodes-incorporated/SD05C-7/31-SD05C-7CT-ND/11643329; LastUpdated: 8/30/2020 9:07:52 PM; Lifecycle Status: Active; Minimum Order: 1; Mounting Type: Surface Mount; Operating Temperature: -65°C ~ 150°C (TJ); Package / Case: SC-76, SOD-323; Packaging: CutTape; PartId: 11493; Price: 0.42; Supplier 1: DigiKey; Supplier Part Number 1: 31-SD05C-7CT-ND; Supplier Device Package: SOD-323; Voltage - Clamping (Max) @ Ipp: 16V
footprint SOD323
pins: 1, 2

## SD05C-TP
designator D?
5V,ESD PROTECTION DEVICES,SOD-32; Manufacturer: Micro Commercial Co; Bidirectional Channels: 1; Capacitance @ Frequency: 125pF @ 1MHz; Current - Peak Pulse (10/1000µs): 24A (8/20µs); Power Line Protection: No; Power - Peak Pulse: 350W; Type: Zener; Voltage - Breakdown (Min): 6V; Voltage - Clamping (Max) @ Ipp: 13.5V; Voltage - Reverse Standoff (Typ): 5V (Max); Part Number: SD05C-TP; Applications: General Purpose; ComponentLink1Description: Datasheet; ComponentLink1URL: https://www.mccsemi.com/pdf/Products/SD05C(SOD-323)-C.pdf; ComponentLink2Description: DigiKey Link; ComponentLink2URL: http://digikey.com/product-detail/en/micro-commercial-co/SD05C-TP/SD05C-TPMSCT-ND/8554544; LastUpdated: 9/2/2020 1:28:29 AM; Lifecycle Status: Active; Minimum Order: 1; Mounting Type: Surface Mount; Operating Temperature: -55°C ~ 150°C (TJ); Package / Case: SC-76, SOD-323; Packaging: TapeAndReel; PartId: 9978; Part Status: Active; Price: 0.08; Series: -; Supplier 1: DigiKey; Supplier Part Number 1: SD05C-TPMSCT-ND; Supplier Device Package: SOD-323
footprint SOD323
pins: 1, 2

## SD05C.TCT
designator D?
TVS DIODE 5V 14.5V SOD323; Manufacturer: Semtech Corporation; Bidirectional Channels: 1; Capacitance @ Frequency: 200pF @ 1MHz; Current - Peak Pulse (10/1000µs): 24A (8/20µs); Power Line Protection: No; Power - Peak Pulse: 350W; Type: Zener; Voltage - Breakdown (Min): 6V; Voltage - Reverse Standoff (Typ): 5V (Max); Part Number: SD05C.TCT; Applications: General Purpose; ComponentLink1Description: Datasheet; ComponentLink1URL: https://www.semtech.com/uploads/documents/sdxxc.pdf; ComponentLink2Description: DigiKey Link; ComponentLink2URL: http://digikey.com/product-detail/en/semtech-corporation/SD05C.TCT/SD05CCT-ND/1000966; LastUpdated: 9/2/2020 1:28:28 AM; Lifecycle Status: Active; Minimum Order: 1; Mounting Type: Surface Mount; Operating Temperature: -55°C ~ 125°C (TJ); Package / Case: SC-76, SOD-323; Packaging: TapeAndReel; PartId: 9914; Part Status: Active; Price: 0.36; Series: -; Supplier 1: DigiKey; Supplier Part Number 1: SD05CCT-ND; Supplier Device Package: SOD-323; Voltage - Clamping (Max) @ Ipp: 14.5V
footprint SOD323
pins: 1, 2

## SD05T1G
designator D?
TVS DIODE 5V 9.8V SOD323; Manufacturer: ON Semiconductor; Capacitance @ Frequency: 350pF @ 1MHz; Current - Peak Pulse (10/1000µs): 24A (8/20µs); Power Line Protection: No; Power - Peak Pulse: 350W; Type: Zener; Unidirectional Channels: 1; Voltage - Breakdown (Min): 6.2V; Part Number: SD05T1G; Applications: Automotive; ComponentLink1Description: Datasheet; ComponentLink1URL: https://www.onsemi.com/pub/Collateral/SD05T1-D.PDF; ComponentLink2Description: DigiKey Link; ComponentLink2URL: http://digikey.com/product-detail/en/on-semiconductor/SD05T1G/SD05T1GOSCT-ND/964630; LastUpdated: 9/2/2020 1:28:27 AM; Lifecycle Status: Active; Minimum Order: 1; Mounting Type: Surface Mount; Operating Temperature: -55°C ~ 150°C (TJ); Package / Case: SC-76, SOD-323; Packaging: TapeAndReel; PartId: 9858; Part Status: Active; Price: 0.07; Series: Automotive, AEC-Q101; Supplier 1: DigiKey; Supplier Part Number 1: SD05T1GOSCT-ND; Supplier Device Package: SOD-323; Voltage - Clamping (Max) @ Ipp: 9.8V; Voltage - Reverse Standoff (Typ): 5V
footprint SOD323
pins: 1, 2

## SD12-01FTG
designator D?
TVS DIODE 12V 22.5V SOD323; Manufacturer: Littelfuse Inc.; Capacitance @ Frequency: 150pF @ 1MHz; Current - Peak Pulse (10/1000µs): 17A (8/20µs); Power Line Protection: No; Power - Peak Pulse: 450W; Type: Zener; Unidirectional Channels: 1; Voltage - Reverse Standoff (Typ): 12V (Max); Part Number: SD12-01FTG; Applications: General Purpose; ComponentLink1Description: Datasheet; ComponentLink1URL: https://www.littelfuse.com/~/media/electronics/datasheets/tvs_diode_arrays/littelfuse_tvs_diode_array_sd_datasheet.pdf.pdf; ComponentLink2Description: DigiKey Link; ComponentLink2URL: http://digikey.com/product-detail/en/littelfuse-inc/SD12-01FTG/F6441CT-ND/5019592; LastUpdated: 9/2/2020 1:28:27 AM; Lifecycle Status: Active; Minimum Order: 1; Mounting Type: Surface Mount; Operating Temperature: -40°C ~ 125°C (TJ); Package / Case: SC-76, SOD-323; Packaging: TapeAndReel; PartId: 9875; Part Status: Active; Price: 0.11; Series: SD, SPA®; Supplier 1: DigiKey; Supplier Part Number 1: F6441CT-ND; Supplier Device Package: SOD-323; Voltage - Clamping (Max) @ Ipp: 22.5V
footprint SOD323
pins: 1, 2

## SD12-7
designator D?